# Altium footprint library UWRT Footprint Library.PcbLib: 258 footprints (part 1 of 17)
Each footprint in its own frame and in the unit in brackets; x right, y up, seen from the top. Pads: shape width x height; smd on the part's side, far side on the other; paste and mask are expansions set on the pad; w line width, h text height; cw(c..) or ccw(c..) is an arc to the next point about the centre after c.
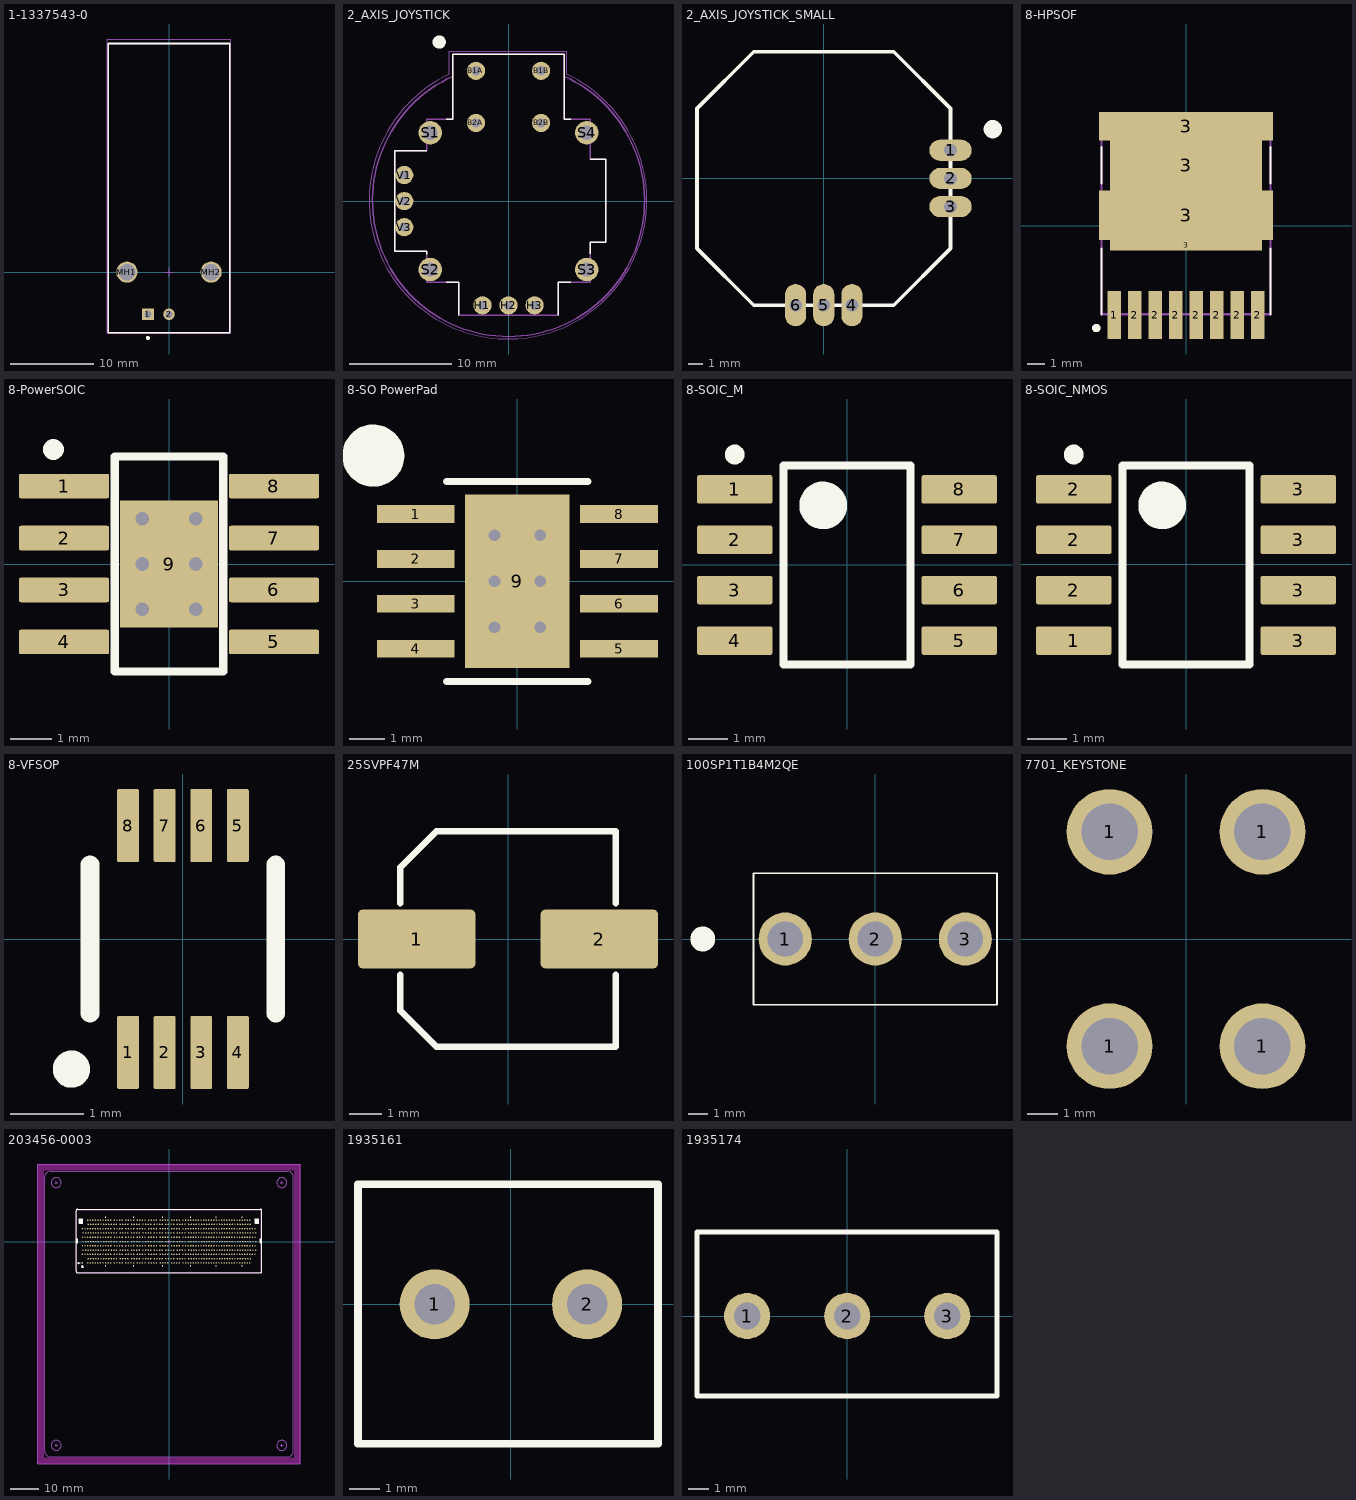
[diagram p0: the footprints below, top view; thin cyan lines are the x and y axes]

## 1-1337543-0 [mm]
pads (4):
  rect 1.4x1.4 hole 0.89: 1(-2.54,-5.08)
  round 1.4 hole 0.89: 2(0,-5.08)
  round 2.55 hole 2.01: MH1(-5.08,0) MH2(5.08,0)
Top Overlay:
  circle w0.25: c-2.54,-7.95 r0.125
  lines w0.2: -7.35,-7.3 7.35,-7.3 7.35,27.6 -7.35,27.6 -7.35,-7.3
Mechanical 13:
  lines w0.1: -7.35,-7.3 -7.35,27.6 7.35,27.6 7.35,-7.3 -7.35,-7.3
Mechanical 15:
  lines w0.05: -7.45,-7.4 -7.45,28.15 7.45,28.15 7.45,-7.4 -7.45,-7.4
  lines w0.1: -0.5,0 0.5,0 ; 0,-0.5 0,0.5
3D body "c-1-1337543-0-e-3d.stp": height 15.8, standoff -4.3, extent -7.35,-7.1 7.35,28.05

## 2_AXIS_JOYSTICK [mil]
pads (14):
  round 70 hole 35.43: B1A(-125,500) B1B(125,500) B2A(-125,300) B2B(125,300)
  round 70 hole 35: H1(-100,-400) H2(0,-400) H3(100,-400) V1(-400,100) V2(-400,0) V3(-400,-100)
  round 90 hole 55: S1(-300,262.5) S2(-300,-262.5) S3(300,-262.5) S4(300,262.5)
Top Overlay:
  circle w27.56: c-265.75,610.24 r11.81
  lines w5: -312.99,-203.54 -312.99,-192.91 -437.01,-192.91 -437.01,192.91 -312.99,192.91 ; -238.98,-311.02 -190.94,-311.02 -190.94,-437.01 ; -238.98,314.96 -214.57,314.96 -214.57,562.99 214.57,562.99 214.57,314.96 239.37,314.96 ; 190.94,-437.01 190.94,-311.02 239.37,-311.02 ; 312.99,-201.57 312.99,-157.48 374.02,-157.48 374.02,161.42 312.99,161.42
Mechanical 13:
  lines w5: -212.33,479.35 ccw(c0,2.45) 212.33,479.35 ; -437.01,-192.91 -312.99,-192.91 -312.99,-311.02 -190.94,-311.02 -190.94,-437.01 190.94,-437.01 190.94,-311.02 312.99,-311.02 312.99,-157.48 374.02,-157.48 374.02,161.42 312.99,161.42 312.99,314.96 214.57,314.96 214.57,562.99 -214.57,562.99 -214.57,314.96 -312.99,314.96 -312.99,192.91 -437.01,192.91 -437.01,-192.91
Mechanical 15:
  lines w1.97: -228.35,486.22 -228.35,574.8 224.41,574.8 224.41,486.22 ; -227.17,486.77 ccw(c-1.97,3.83) 223.23,486.77
3D body "9032.STEP": height 1190, standoff -175, extent -522.49,-527.49 527.51,560

## 2_AXIS_JOYSTICK_SMALL [mm]
pads (6):
  oval 3x1.5 hole 0.9: 1(9,2) 2(9,0) 3(9,-2)
  oval 1.5x3 hole 0.9: 4(2,-9) 5(0,-9) 6(-2,-9)
Top Overlay:
  circle w0.7: c12,3.5 r0.3
  lines w0.254: -9,-4.97 -4.97,-9 0,-9 4.97,-9 9,-4.97 9,0 9,4.97 4.97,9 0,9 -4.97,9 -9,4.97 -9,0 -9,-4.97

## 8-HPSOF [mm]
pads (12):
  rect 0.8x2.8 smd: 1(-4.2,-5.24) 2(-3,-5.24) 2(-1.8,-5.24) 2(-0.6,-5.24) 2(0.6,-5.24) 2(1.8,-5.24) 2(3,-5.24) 2(4.2,-5.24)
  rect 8.9x0.6 smd: 3(0,-1.16)
  rect 10.2x2.9 smd: 3(0,0.59)
  rect 8.9x2.95 smd: 3(0,3.515)
  rect 10.2x1.65 smd: 3(0,5.815)
Top Overlay:
  circle w0.24: c-5.25,-6 r0.12
  lines w0.127: -4.95,-5.19 -4.95,-1.35 ; -4.95,2.45 -4.95,4.6 ; 4.95,-5.19 4.95,-1.35 ; 4.95,2.45 4.95,4.6
Top Paste:
  region: -2.811,5.15 2.81,5.15 2.81,0.03 -2.811,0.03
Mechanical 4:
  circle w0.25: c-5.25,-6 r0.12
  lines w0.127: -4.95,-5.19 -4.95,5.19 ; -4.95,-5.19 4.95,-5.19 ; -4.95,-5.19 4.95,-5.19 ; -4.95,-5.19 -4.95,5.19 ; -4.95,5.19 4.95,5.19 ; -4.95,5.19 4.95,5.19 ; 4.95,-5.19 4.95,5.19 ; 4.95,-5.19 4.95,5.19
3D body "User Library-PG-HSOF-8-1.step": height 2.3, standoff 0, extent -4.95,-5.834 4.95,5.841

## 8-PowerSOIC [mm] "Texas Instruments 8-SO PowerPad"
pads (9):
  rrect15% 2.2x0.6 smd: 1(-2.565,1.905) 2(-2.565,0.635) 3(-2.565,-0.635) 4(-2.565,-1.905) 5(2.565,-1.905) 6(2.565,-0.635) 7(2.565,0.635) 8(2.565,1.905)
  rect 2.4x3.1 smd: 9(0,0)
via 0.65,0 diameter 0.63 hole 0.33
via -0.65,0 diameter 0.63 hole 0.33
via -0.65,1.1 diameter 0.63 hole 0.33
via 0.65,1.1 diameter 0.63 hole 0.33
via 0.65,-1.1 diameter 0.63 hole 0.33
via -0.65,-1.1 diameter 0.63 hole 0.33
Top Overlay:
  circle w0.254: c-2.824,2.797 r0.127
  lines w0.2: -1.325,-2.625 1.324,-2.625 1.324,2.625 -1.325,2.625 ; -1.324,-2.625 -1.324,2.625
3D body "SOIC-8.step": height 1.75, standoff 0, extent -3,-2.45 3,2.45

## 8-SO PowerPad [mm]
pads (9):
  rect 2.2x0.5 smd paste-1000 mask+0: 1(-2.875,1.905) 2(-2.875,0.635) 3(-2.875,-0.635) 4(-2.875,-1.905) 5(2.875,-1.905) 6(2.875,-0.635) 7(2.875,0.635) 8(2.875,1.905)
  rect 2.95x4.9 smd paste-1000 mask-1000: 9(0,0)
via 0.65,-1.3 diameter 0.63 hole 0.33
via 0.65,0 diameter 0.63 hole 0.33
via 0.65,1.3 diameter 0.63 hole 0.33
via -0.65,-1.3 diameter 0.63 hole 0.33
via -0.65,0 diameter 0.63 hole 0.33
via -0.65,1.3 diameter 0.63 hole 0.33
Top Overlay:
  circle w0.889: c-4.075,3.556 r0.432
  lines w0.2: -2,-2.825 2,-2.825 ; -2,2.825 2,2.825
Top Paste:
  rectangle: 1.8,-2.13 3.95,-1.68
  rectangle: 1.8,-0.86 3.95,-0.41
  rectangle: 1.8,0.41 3.95,0.86
  rectangle: 1.8,1.68 3.95,2.13
  rectangle: -3.95,-2.13 -1.8,-1.68
  rectangle: -3.95,-0.86 -1.8,-0.41
  rectangle: -3.95,0.41 -1.8,0.86
  rectangle: -3.95,1.68 -1.8,2.13
  rectangle: -1.2,-1.55 1.2,1.55
Top Solder:
  rectangle: -1.2,-1.55 1.2,1.55
Mechanical 16:
  lines w0.1: -0.5,0 0.5,0 ; 0,-0.5 0,0.5
3D body "IC_Texas_Instruments_TPS54360BQDDARQ1_eec.STEP": height 0.25, standoff 0, extent -4.075,-2.675 4.075,2.675

## 8-SOIC_M [mm] "SOIC, 8-Leads, Body 5x4mm, Pitch 1.27mm, IPC Low Density"
height 1.75
pads (8):
  rrect15% 1.9x0.72 smd: 1(-2.825,1.905) 2(-2.825,0.635) 3(-2.825,-0.635) 4(-2.825,-1.905) 5(2.825,-1.905) 6(2.825,-0.635) 7(2.825,0.635) 8(2.825,1.905)
Top Overlay:
  circle w0.25: c-2.825,2.78 r0.125
  circle w0.6: c-0.6,1.5 r0.3
  lines w0.2: -1.6,-2.5 -1.6,2.5 1.6,2.5 1.6,-2.5 -1.6,-2.5
3D body "SOIC-8akaD0008AakaM08A.stp": height 1.63, standoff 0, extent -3,-2.45 3,2.45

## 8-SOIC_NMOS [mm]
pads (8):
  rrect15% 1.9x0.72 smd: 1(-2.827,-1.926) 2(-2.827,-0.656) 2(-2.827,0.614) 2(-2.827,1.884) 3(2.823,-1.926) 3(2.823,-0.656) 3(2.823,0.614) 3(2.823,1.884)
Top Overlay:
  circle w0.25: c-2.827,2.759 r0.125
  circle w0.6: c-0.602,1.479 r0.3
  lines w0.2: -1.602,-2.521 -1.602,2.479 1.598,2.479 1.598,-2.521 -1.602,-2.521
3D body "SOIC-8akaD0008AakaM08A.stp": height 1.63, standoff 0, extent -3,-2.45 3,2.45

## 8-VFSOP [mm]
pads (8):
  rrect15% 0.3x1 smd: 1(-0.75,-1.55) 2(-0.25,-1.55) 3(0.25,-1.55) 4(0.75,-1.55) 5(0.75,1.55) 6(0.25,1.55) 7(-0.25,1.55) 8(-0.75,1.55)
Top Overlay:
  circle w0.254: c-1.524,-1.778 r0.127
  lines w0.254: -1.27,-1.016 -1.27,1.016 ; 1.27,-1.016 1.27,1.016
3D body "User Library-TSSOP50P310X90-8N.STEP": height 0.9, standoff 0, extent -1.05,-1.549 1.05,1.549

## 25SVPF47M [mm] "Aluminum Electrolytic Capacitor, Body 6.60x6.60x6.10mm, IPC Low Density"
height 6.1
pads (2):
  rrect15% 3.6x1.8 smd: 1(-2.8,0) 2(2.8,0)
Top Overlay:
  lines w0.2: -3.3,-1.1 -3.3,-2.2 -2.2,-3.3 3.3,-3.3 3.3,-1.1 ; -3.3,1.1 -3.3,2.2 -2.2,3.3 3.3,3.3 3.3,1.1
3D body "6.3 SIZE CODE C6 NEW.STEP": height 5.9, standoff 0, extent -3.65,-3.3 3.65,3.3

## 93AA66AT-I/MS [mm]

## 100SP1T1B4M2QE [mm]
pads (3):
  round 2.775 hole 1.85: 1(-4.7,0) 2(0,0) 3(4.7,0)
Top Overlay:
  circle w0.7: c-9,0 r0.3
  lines w0.1: -6.35,-3.43 -6.35,3.43 6.35,3.43 6.35,-3.43 -6.35,-3.43
3D body "Switch_2.stp": height 29.63, standoff -5.15, extent -6.35,-3.43 6.35,3.43

## 7701_KEYSTONE [mm] "Through hole screw terminal footprint"
pads (4):
  round 2.8 hole 1.85: 1(-2.5,-3.505) 1(-2.5,3.505) 1(2.5,-3.505) 1(2.5,3.505)
3D body "User Library-Keystone_7693.STEP": height 8.2, standoff -5.1, extent -4.008,-4.635 3.992,4.49

## 203456-0003 [mm]
pads (700):
  round 0.5 smd: A3(-28.6,-7.5) A4(-27.7,-7.5) A5(-26.8,-7.5) A6(-25.9,-7.5) A7(-25,-7.5) A8(-24.1,-7.5) A9(-23.2,-7.5) A10(-22.3,-7.5) A11(-21.4,-7.5) A12(-20.5,-7.5) A13(-19.2,-7.5) A14(-18.3,-7.5) A15(-17.4,-7.5) A16(-16.5,-7.5) A17(-15.2,-7.5) A18(-14.3,-7.5) A19(-13.4,-7.5) A20(-12.5,-7.5) A21(-11.2,-7.5) A22(-10.3,-7.5) A23(-9.4,-7.5) A24(-8.5,-7.5) A25(-7.2,-7.5) A26(-6.3,-7.5) A27(-5.4,-7.5) A28(-4.5,-7.5) A29(-3.2,-7.5) A30(-2.3,-7.5) A31(-1.4,-7.5) A32(-0.5,-7.5) A33(0.8,-7.5) A34(1.7,-7.5) A35(2.6,-7.5) A36(3.5,-7.5) A37(4.8,-7.5) A38(5.7,-7.5) A39(6.6,-7.5) A40(7.5,-7.5) A41(8.4,-7.5) A42(9.3,-7.5) A43(10.2,-7.5) A44(11.1,-7.5) A45(12,-7.5) A46(12.9,-7.5) A47(13.8,-7.5) A48(14.7,-7.5) A49(15.6,-7.5) A50(16.5,-7.5) A51(17.4,-7.5) A52(18.3,-7.5) A53(19.2,-7.5) A54(20.1,-7.5) A55(21,-7.5) A56(21.9,-7.5) A57(22.8,-7.5) A58(23.7,-7.5) A59(24.6,-7.5) A60(25.5,-7.5) A61(26.4,-7.5) A62(27.3,-7.5) A63(28.2,-7.5) B3(-28.4,-6) B4(-27.5,-6) B5(-26.6,-6) B6(-25.7,-6) B7(-24.8,-6) B8(-23.9,-6) B9(-23,-6) B10(-22.1,-6) B11(-21.2,-6) B12(-20.3,-6) B13(-19.4,-6) B14(-18.5,-6) B15(-17.2,-6) B16(-16.3,-6) B17(-15.4,-6) B18(-14.5,-6) B19(-13.2,-6) B20(-12.3,-6) B21(-11.4,-6) B22(-10.5,-6) B23(-9.2,-6) B24(-8.3,-6) B25(-7.4,-6) B26(-6.5,-6) B27(-5.2,-6) B28(-4.3,-6) B29(-3.4,-6) B30(-2.5,-6) B31(-1.2,-6) B32(-0.3,-6) B33(0.6,-6) B34(1.5,-6) B35(2.8,-6) B36(3.7,-6) B37(4.6,-6) B38(5.5,-6) B39(6.8,-6) B40(7.7,-6) B41(8.6,-6) B42(9.5,-6) B43(10.4,-6) B44(11.3,-6) B45(12.2,-6) B46(13.1,-6) B47(14,-6) B48(14.9,-6) B49(15.8,-6) B50(16.7,-6) B51(17.6,-6) B52(18.5,-6) B53(19.4,-6) B54(20.3,-6) B55(21.2,-6) B56(22.1,-6) B57(23,-6) B58(23.9,-6) B59(24.8,-6) B60(25.7,-6) B61(26.6,-6) B62(27.5,-6) B63(28.4,-6) C1(-30.4,-4.5) C2(-29.5,-4.5) C3(-28.6,-4.5) C4(-27.7,-4.5) C5(-26.8,-4.5) C6(-25.9,-4.5) C7(-25,-4.5) C8(-24.1,-4.5) C9(-23.2,-4.5) C10(-22.3,-4.5) C11(-21.4,-4.5) C12(-20.5,-4.5) C13(-19.2,-4.5) C14(-18.3,-4.5) C15(-17.4,-4.5) C16(-16.5,-4.5) C17(-15.2,-4.5) C18(-14.3,-4.5) C19(-13.4,-4.5) C20(-12.5,-4.5) C21(-11.2,-4.5) C22(-10.3,-4.5) C23(-9.4,-4.5) C24(-8.5,-4.5) C25(-7.2,-4.5) C26(-6.3,-4.5) C27(-5.4,-4.5) C28(-4.5,-4.5) C29(-3.2,-4.5) C30(-2.3,-4.5) C31(-1.4,-4.5) C32(-0.5,-4.5) C33(0.8,-4.5) C34(1.7,-4.5) C35(2.6,-4.5) C36(3.5,-4.5) C37(4.8,-4.5) C38(5.7,-4.5) C39(6.6,-4.5) C40(7.5,-4.5) C41(8.4,-4.5) C42(9.3,-4.5) C43(10.2,-4.5) C44(11.1,-4.5) C45(12,-4.5) C46(12.9,-4.5) C47(13.8,-4.5) C48(14.7,-4.5) C49(15.6,-4.5) C50(16.5,-4.5) C51(17.4,-4.5) C52(18.3,-4.5) C53(19.2,-4.5) C54(20.1,-4.5) C55(21,-4.5) C56(21.9,-4.5) C57(22.8,-4.5) C58(23.7,-4.5) C59(24.6,-4.5) C60(25.5,-4.5) C61(26.4,-4.5) C62(27.3,-4.5) C63(28.2,-4.5) C64(29.1,-4.5) C65(30,-4.5) D1(-30.2,-3) D2(-29.3,-3) D3(-28.4,-3) D4(-27.5,-3) D5(-26.6,-3) D6(-25.7,-3) D7(-24.8,-3) D8(-23.9,-3) D9(-23,-3) D10(-22.1,-3) D11(-21.2,-3) D12(-20.3,-3) D13(-19.4,-3) D14(-18.5,-3) D15(-17.2,-3) D16(-16.3,-3) D17(-15.4,-3) D18(-14.5,-3) D19(-13.2,-3) D20(-12.3,-3) D21(-11.4,-3) D22(-10.5,-3) D23(-9.2,-3) D24(-8.3,-3) D25(-7.4,-3) D26(-6.5,-3) D27(-5.2,-3) D28(-4.3,-3) D29(-3.4,-3) D30(-2.5,-3) D31(-1.2,-3) D32(-0.3,-3) D33(0.6,-3) D34(1.5,-3) D35(2.8,-3) D36(3.7,-3) D37(4.6,-3) D38(5.5,-3) D39(6.8,-3) D40(7.7,-3) D41(8.6,-3) D42(9.5,-3) D43(10.4,-3) D44(11.3,-3) D45(12.2,-3) D46(13.1,-3) D47(14,-3) D48(14.9,-3) D49(15.8,-3) D50(16.7,-3) D51(17.6,-3) D52(18.5,-3) D53(19.4,-3) D54(20.3,-3) D55(21.2,-3) D56(22.1,-3) D57(23,-3) D58(23.9,-3) D59(24.8,-3) D60(25.7,-3) D61(26.6,-3) D62(27.5,-3) D63(28.4,-3) D64(29.3,-3) D65(30.2,-3) E1(-30.4,-1.5) E2(-29.5,-1.5) E3(-28.6,-1.5) E4(-27.7,-1.5) E5(-26.8,-1.5) E6(-25.9,-1.5) E7(-25,-1.5) E8(-24.1,-1.5) E9(-23.2,-1.5) E10(-22.3,-1.5) E11(-21.4,-1.5) E12(-20.5,-1.5) E13(-19.2,-1.5) E14(-18.3,-1.5) E15(-17.4,-1.5) E16(-16.5,-1.5) E17(-15.2,-1.5) E18(-14.3,-1.5) E19(-13.4,-1.5) E20(-12.5,-1.5) E21(-11.2,-1.5) E22(-10.3,-1.5) E23(-9.4,-1.5) E24(-8.5,-1.5) E25(-7.2,-1.5) E26(-6.3,-1.5) E27(-5.4,-1.5) E28(-4.5,-1.5) E29(-3.2,-1.5) E30(-2.3,-1.5) E31(-1.4,-1.5) E32(-0.5,-1.5) E33(0.8,-1.5) E34(1.7,-1.5) E35(2.6,-1.5) E36(3.5,-1.5) E37(4.8,-1.5) E38(5.7,-1.5) E39(6.6,-1.5) E40(7.5,-1.5) E41(8.4,-1.5) E42(9.3,-1.5) E43(10.2,-1.5) E44(11.1,-1.5) E45(12,-1.5) E46(12.9,-1.5) E47(13.8,-1.5) E48(14.7,-1.5) E49(15.6,-1.5) E50(16.5,-1.5) E51(17.4,-1.5) E52(18.3,-1.5) E53(19.2,-1.5) E54(20.1,-1.5) E55(21,-1.5) E56(21.9,-1.5) E57(22.8,-1.5) E58(23.7,-1.5) E59(24.6,-1.5) E60(25.5,-1.5) E61(26.4,-1.5) E62(27.3,-1.5) E63(28.2,-1.5) E64(29.1,-1.5) E65(30,-1.5) F1(-30.2,0) F2(-29.3,0) F3(-28.4,0) F4(-27.5,0) F5(-26.6,0) F6(-25.7,0) F7(-24.8,0) F8(-23.9,0) F9(-23,0) F10(-22.1,0) F11(-21.2,0) F12(-20.3,0) F13(-19.4,0) F14(-18.5,0) F15(-17.2,0) F16(-16.3,0) F17(-15.4,0) F18(-14.5,0) F19(-13.2,0) F20(-12.3,0) F21(-11.4,0) F22(-10.5,0) F23(-9.2,0) F24(-8.3,0) F25(-7.4,0) F26(-6.5,0) F27(-5.2,0) F28(-4.3,0) F29(-3.4,0) F30(-2.5,0) F31(-1.2,0) F32(-0.3,0) F33(0.6,0) F34(1.5,0) F35(2.8,0) F36(3.7,0) F37(4.6,0) F38(5.5,0) F39(6.8,0) F40(7.7,0) F41(8.6,0) F42(9.5,0) F43(10.4,0) F44(11.3,0) F45(12.2,0) F46(13.1,0) F47(14,0) F48(14.9,0) F49(15.8,0) F50(16.7,0) F51(17.6,0) F52(18.5,0) F53(19.4,0) F54(20.3,0) F55(21.2,0) F56(22.1,0) F57(23,0) F58(23.9,0) F59(24.8,0) F60(25.7,0) F61(26.6,0) F62(27.5,0) F63(28.4,0) F64(29.3,0) F65(30.2,0) G1(-30.4,1.5) G2(-29.5,1.5) G3(-28.6,1.5) G4(-27.7,1.5) G5(-26.8,1.5) G6(-25.9,1.5) G7(-25,1.5) G8(-24.1,1.5) G9(-23.2,1.5) G10(-22.3,1.5) G11(-21.4,1.5) G12(-20.5,1.5) G13(-19.2,1.5) G14(-18.3,1.5) G15(-17.4,1.5) G16(-16.5,1.5) G17(-15.2,1.5) G18(-14.3,1.5) G19(-13.4,1.5) G20(-12.5,1.5) G21(-11.2,1.5) G22(-10.3,1.5) G23(-9.4,1.5) G24(-8.5,1.5) G25(-7.2,1.5) G26(-6.3,1.5) G27(-5.4,1.5) G28(-4.5,1.5) G29(-3.2,1.5) G30(-2.3,1.5) G31(-1.4,1.5) G32(-0.5,1.5) G33(0.8,1.5) G34(1.7,1.5) G35(2.6,1.5) G36(3.5,1.5) G37(4.8,1.5) G38(5.7,1.5) G39(6.6,1.5) G40(7.5,1.5) G41(8.4,1.5) G42(9.3,1.5) G43(10.2,1.5) G44(11.1,1.5) G45(12,1.5) G46(12.9,1.5) G47(13.8,1.5) G48(14.7,1.5) G49(15.6,1.5) G50(16.5,1.5) G51(17.4,1.5) G52(18.3,1.5) G53(19.2,1.5) G54(20.1,1.5) G55(21,1.5) G56(21.9,1.5) G57(22.8,1.5) G58(23.7,1.5) G59(24.6,1.5) G60(25.5,1.5) G61(26.4,1.5) G62(27.3,1.5) G63(28.2,1.5) G64(29.1,1.5) G65(30,1.5) H1(-30.2,3) H2(-29.3,3) H3(-28.4,3) H4(-27.5,3) H5(-26.6,3) H6(-25.7,3) H7(-24.8,3) H8(-23.9,3) H9(-23,3) H10(-22.1,3) H11(-21.2,3) H12(-20.3,3) H13(-19.4,3) H14(-18.5,3) H15(-17.2,3) H16(-16.3,3) H17(-15.4,3) H18(-14.5,3) H19(-13.2,3) H20(-12.3,3) H21(-11.4,3) H22(-10.5,3) H23(-9.2,3) H24(-8.3,3) H25(-7.4,3) H26(-6.5,3) H27(-5.2,3) H28(-4.3,3) H29(-3.4,3) H30(-2.5,3) H31(-1.2,3) H32(-0.3,3) H33(0.6,3) H34(1.5,3) H35(2.8,3) H36(3.7,3) H37(4.6,3) H38(5.5,3) H39(6.8,3) H40(7.7,3) H41(8.6,3) H42(9.5,3) H43(10.4,3) H44(11.3,3) H45(12.2,3) H46(13.1,3) H47(14,3) H48(14.9,3) H49(15.8,3) H50(16.7,3) H51(17.6,3) H52(18.5,3) H53(19.4,3) H54(20.3,3) H55(21.2,3) H56(22.1,3) H57(23,3) H58(23.9,3) H59(24.8,3) H60(25.7,3) H61(26.6,3) H62(27.5,3) H63(28.4,3) H64(29.3,3) H65(30.2,3) J1(-30.4,4.5) J2(-29.5,4.5) J3(-28.6,4.5) J4(-27.7,4.5) J5(-26.8,4.5) J6(-25.9,4.5) J7(-25,4.5) J8(-24.1,4.5) J9(-23.2,4.5) J10(-22.3,4.5) J11(-21.4,4.5) J12(-20.5,4.5) J13(-19.2,4.5) J14(-18.3,4.5) J15(-17.4,4.5) J16(-16.5,4.5) J17(-15.2,4.5) J18(-14.3,4.5) J19(-13.4,4.5) J20(-12.5,4.5) J21(-11.2,4.5) J22(-10.3,4.5) J23(-9.4,4.5) J24(-8.5,4.5) J25(-7.2,4.5) J26(-6.3,4.5) J27(-5.4,4.5) J28(-4.5,4.5) J29(-3.2,4.5) J30(-2.3,4.5) J31(-1.4,4.5) J32(-0.5,4.5) J33(0.8,4.5) J34(1.7,4.5) J35(2.6,4.5) J36(3.5,4.5) J37(4.8,4.5) J38(5.7,4.5) J39(6.6,4.5) J40(7.5,4.5) J41(8.4,4.5) J42(9.3,4.5) J43(10.2,4.5) J44(11.1,4.5) J45(12,4.5) J46(12.9,4.5) J47(13.8,4.5) J48(14.7,4.5) J49(15.6,4.5) J50(16.5,4.5) J51(17.4,4.5) J52(18.3,4.5) J53(19.2,4.5) J54(20.1,4.5) J55(21,4.5) J56(21.9,4.5) J57(22.8,4.5) J58(23.7,4.5) J59(24.6,4.5) J60(25.5,4.5) J61(26.4,4.5) J62(27.3,4.5) J63(28.2,4.5) J64(29.1,4.5) J65(30,4.5) K3(-28.4,6) K4(-27.5,6) K5(-26.6,6) K6(-25.7,6) K7(-24.8,6) K8(-23.9,6) K9(-23,6) K10(-22.1,6) K11(-21.2,6) K12(-20.3,6) K13(-19.4,6) K14(-18.5,6) K15(-17.2,6) K16(-16.3,6) K17(-15.4,6) K18(-14.5,6) K19(-13.2,6) K20(-12.3,6) K21(-11.4,6) K22(-10.5,6) K23(-9.2,6) K24(-8.3,6) K25(-7.4,6) K26(-6.5,6) K27(-5.2,6) K28(-4.3,6) K29(-3.4,6) K30(-2.5,6) K31(-1.2,6) K32(-0.3,6) K33(0.6,6) K34(1.5,6) K35(2.8,6) K36(3.7,6) K37(4.6,6) K38(5.5,6) K39(6.8,6) K40(7.7,6) K41(8.6,6) K42(9.5,6) K43(10.4,6) K44(11.3,6) K45(12.2,6) K46(13.1,6) K47(14,6) K48(14.9,6) K49(15.8,6) K50(16.7,6) K51(17.6,6) K52(18.5,6) K53(19.4,6) K54(20.3,6) K55(21.2,6) K56(22.1,6) K57(23,6) K58(23.9,6) K59(24.8,6) K60(25.7,6) K61(26.6,6) K62(27.5,6) K63(28.4,6) L3(-28.6,7.5) L4(-27.7,7.5) L5(-26.8,7.5) L6(-25.9,7.5) L7(-25,7.5) L8(-24.1,7.5) L9(-23.2,7.5) L10(-22.3,7.5) L11(-21.4,7.5) L12(-20.5,7.5) L13(-19.2,7.5) L14(-18.3,7.5) L15(-17.4,7.5) L16(-16.5,7.5) L17(-15.2,7.5) L18(-14.3,7.5) L19(-13.4,7.5) L20(-12.5,7.5) L21(-11.2,7.5) L22(-10.3,7.5) L23(-9.4,7.5) L24(-8.5,7.5) L25(-7.2,7.5) L26(-6.3,7.5) L27(-5.4,7.5) L28(-4.5,7.5) L29(-3.2,7.5) L30(-2.3,7.5) L31(-1.4,7.5) L32(-0.5,7.5) L33(0.8,7.5) L34(1.7,7.5) L35(2.6,7.5) L36(3.5,7.5) L37(4.8,7.5) L38(5.7,7.5) L39(6.6,7.5) L40(7.5,7.5) L41(8.4,7.5) L42(9.3,7.5) L43(10.2,7.5) L44(11.1,7.5) L45(12,7.5) L46(12.9,7.5) L47(13.8,7.5) L48(14.7,7.5) L49(15.6,7.5) L50(16.5,7.5) L51(17.4,7.5) L52(18.3,7.5) L53(19.2,7.5) L54(20.1,7.5) L55(21,7.5) L56(21.9,7.5) L57(22.8,7.5) L58(23.7,7.5) L59(24.6,7.5) L60(25.5,7.5) L61(26.4,7.5) L62(27.3,7.5) L63(28.2,7.5)
  round 0.5 on Top Overlay: ""(-30.4,-7.5)
Top Layer keep-out:
  region: 43.7,-75.665 43.7,24.935 -43.9,24.935 -43.9,-75.665 43.7,-75.665 45.9,-77.865 -46.1,-77.865 -46.1,27.135 45.9,27.135 45.9,-77.865
Top Overlay:
  rectangle: 30.156,6.406 31.25,7.969
  region: -30.356,7.969 -31.45,7.969 -31.45,6.406 -30.356,6.406
  rectangle: 31.875,-0.469 32.406,0.937
  region: -32.075,0.937 -32.606,0.937 -32.606,-0.469 -32.075,-0.469
  region: -30.4,-8.301 -30.718,-8.936 -30.083,-8.936
  region: -31.201,-7.5 -31.836,-7.182 -31.836,-7.817
  lines w0.125: -22.3,-8.619 -22.3,-8.301 ; -22.3,8.301 -22.3,8.619 ; -12.5,-8.619 -12.5,-8.301 ; -12.5,8.301 -12.5,8.619 ; -2.3,-8.619 -2.3,-8.301 ; -2.3,8.301 -2.3,8.619 ; 7.5,-8.619 7.5,-8.301 ; 7.5,8.301 7.5,8.619 ; 16.5,-8.619 16.5,-8.301 ; 16.5,8.301 16.5,8.619 ; 25.5,-8.619 25.5,-8.301 ; 25.5,8.301 25.5,8.619
  lines w0.19: -32.606,-0.469 -32.075,-0.469 -32.075,0.937 -32.606,0.937 ; 32.406,-0.469 31.875,-0.469 31.875,0.937 32.406,0.937 ; -32.606,-10.423 ccw(c-32.073,-10.423) -32.073,-10.956 31.873,-10.956 ccw(c31.873,-10.423) 32.406,-10.423 32.406,10.823 ccw(c31.873,10.823) 31.873,11.356 -32.073,11.356 ccw(c-32.073,10.823) -32.606,10.823 -32.606,-10.423 ; -31.45,6.406 -30.356,6.406 -30.356,7.969 -31.45,7.969 -31.45,6.406 ; 30.156,6.406 31.25,6.406 31.25,7.969 30.156,7.969 30.156,6.406
  lines w0.191: -31.836,-7.817 -31.836,-7.182 -31.201,-7.5 -31.836,-7.817 ; -30.718,-8.936 -30.4,-8.301 -30.083,-8.936 -30.718,-8.936
Mechanical 1:
  circle w0.125: c-39.6,-71.365 r1.75
  circle w0.125: c39.4,-71.365 r1.75
  circle w0.125: c-39.6,20.635 r1.75
  circle w0.125: c39.4,20.635 r1.75
  lines w0.125: -40.1,-71.365 -39.1,-71.365 ; -40.1,20.635 -39.1,20.635 ; -39.6,-71.865 -39.6,-70.865 ; -39.6,20.135 -39.6,21.135 ; 38.9,-71.365 39.9,-71.365 ; 38.9,20.635 39.9,20.635 ; 39.4,-71.865 39.4,-70.865 ; 39.4,20.135 39.4,21.135
Mechanical 2:
  circle w0.125: c39.4,-71.365 r1.75
  circle w0.125: c-39.6,-71.365 r1.75
  circle w0.125: c39.4,20.635 r1.75
  circle w0.125: c-39.6,20.635 r1.75
  lines w0.125: -40.1,-71.365 -39.1,-71.365 ; -40.1,20.635 -39.1,20.635 ; -39.6,-71.865 -39.6,-70.865 ; -39.6,20.135 -39.6,21.135 ; 38.9,-71.365 39.9,-71.365 ; 38.9,20.635 39.9,20.635 ; 39.4,-71.865 39.4,-70.865 ; 39.4,20.135 39.4,21.135 ; -43.6,-73.365 ccw(c-41.6,-73.365) -41.6,-75.365 41.4,-75.365 ccw(c41.4,-73.365) 43.4,-73.365 43.4,22.635 ccw(c41.4,22.635) 41.4,24.635 -41.6,24.635 ccw(c-41.6,22.635) -43.6,22.635 -43.6,-73.365
  text "NVIDIA Jetson Xavier AGX Module (Production)" at -42.35,-74.115 h1.52
  text "NVIDIA Jetson Xavier AGX Module (Production)" at 42.15,-74.115 h1.52
  text "NVIDIA Jetson Xavier AGX Module (Production)" at 42.15,23.385 h1.52
  text "NVIDIA Jetson Xavier AGX Module (Production)" at -42.35,23.385 h1.52
Mechanical 3:
  circle w0.125: c-39.6,-71.365 r1.75
  circle w0.125: c39.4,-71.365 r1.75
  circle w0.125: c39.4,20.635 r1.75
  circle w0.125: c-39.6,20.635 r1.75
  lines w0.125: -40.1,-71.365 -39.1,-71.365 ; -40.1,20.635 -39.1,20.635 ; -39.6,-71.865 -39.6,-70.865 ; -39.6,20.135 -39.6,21.135 ; 38.9,-71.365 39.9,-71.365 ; 38.9,20.635 39.9,20.635 ; 39.4,-71.865 39.4,-70.865 ; 39.4,20.135 39.4,21.135 ; -46.1,-77.865 -46.1,27.135 45.9,27.135 45.9,-77.865 -46.1,-77.865
  text "NVIDIA Jetson Xavier AGX Module (Dev Kit)" at -43.6,24.635 h1.52
  text "NVIDIA Jetson Xavier AGX Module (Dev Kit)" at 43.4,-75.365 h1.52
  text "NVIDIA Jetson Xavier AGX Module (Dev Kit)" at 43.4,24.635 h1.52
  text "NVIDIA Jetson Xavier AGX Module (Dev Kit)" at -43.6,-75.365 h1.52
Route Tool Path:
  lines w0.064: -32.45,-10.8 -32.45,11.2 32.25,11.2 32.25,-10.8 -32.45,-10.8
Mechanical 15:
  lines w0.125: -0.5,0 0.5,0 ; 0,-0.5 0,0.5 ; -46.1,-77.865 -46.1,27.135 45.9,27.135 45.9,-77.865 -46.1,-77.865
3D body "2034560003.stp": height 7.66, standoff -0.25, extent -32.45,-10.8 32.25,11.2

## 1935161 [mm] "TERM BLK 2POS SIDE ENTRY 5MM PCB"
pads (2):
  round 2.3 hole 1.325: 1(-2.5,0) 2(2.5,0)
Top Overlay:
  lines w0.254: -5.015,-4.572 -5.015,3.938 4.826,3.938 4.826,-4.572 -5.015,-4.572
3D body "1935161--3DModel-STEP-56544.STEP": height 11.41, standoff -3.49, extent -5.015,-5.062 5.385,3.938

## 1935174 [mm] "5 MM PITCH"
height 11.4
pads (3):
  round 2.3 hole 1.325: 1(-5,0) 2(0,0) 3(5,0)
Top Overlay:
  lines w0.254: 7.485,-4 -7.5,-4 -7.5,4.2 7.485,4.2 7.485,-4 ; 7.485,-4 7.485,-4
3D body "pxc_1935174_03_PT-1-5-3-5-0-H_3D.stp": height 11.41, standoff -3.49, extent -8.085,-4 7.485,5